# Altium footprint library my Library.PcbLib: 1247 footprints (part 20 of 78)
Each footprint in its own frame and in the unit in brackets; x right, y up, seen from the top. Pads: shape width x height; smd on the part's side, far side on the other; paste and mask are expansions set on the pad; w line width, h text height; cw(c..) or ccw(c..) is an arc to the next point about the centre after c.
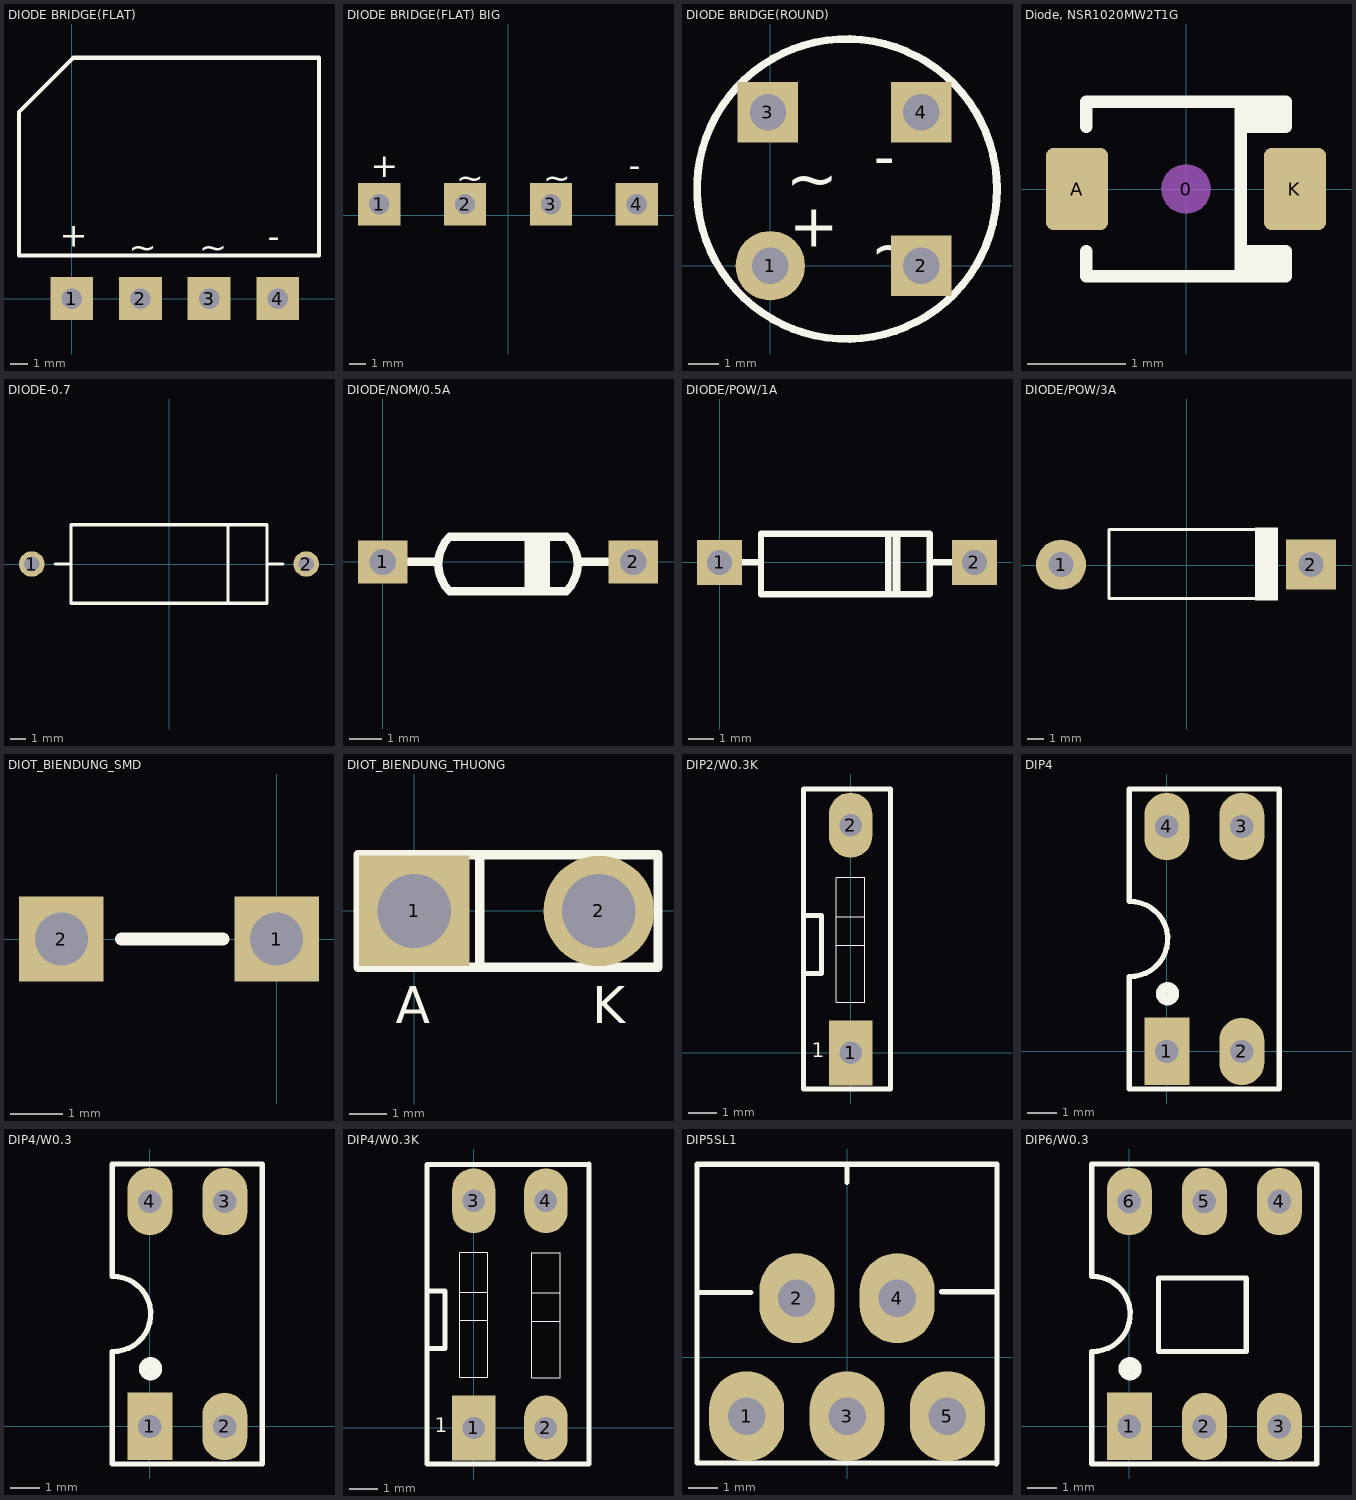
[diagram p19: the footprints below, top view; thin cyan lines are the x and y axes]

## DIODE BRIDGE(FLAT) [mm]
pads (4):
  rect 2.5x2.5 / inner round 1.575 / far side rect 2.5x2.5 hole 1.2: 1(0,0) 2(4,0) 3(8,0) 4(12,0)
Top Overlay:
  lines w0.254: -3.073,2.515 2.045,2.515 14.402,2.515 14.402,14.021 0.076,14.021 -3.073,10.871 -3.073,2.515
  text "~" at 3.327,2.286 h1.43
  text "~" at 7.417,2.299 h1.43
  text "+" at -0.686,3.01 h1.43
  text "-" at 11.405,2.946 h1.43

## DIODE BRIDGE(FLAT) BIG [mm]
pads (4):
  rect 2.5x2.5 hole 1.2: 1(-7.62,0.66) 2(-2.54,0.66) 3(2.54,0.66) 4(7.62,0.66)
Top Overlay:
  text "-" at 7.137,2.286 h1.43
  text "+" at -8.103,2.261 h1.43
  text "~" at 2.083,1.549 h1.43
  text "~" at -3.073,1.549 h1.43
3D body: height 24.27, standoff -12.36, extent -11.15,-1.78 11.15,1.98

## DIODE BRIDGE(ROUND) [mm]
height 5.59
pads (4):
  round 2.3 hole 1.2: 1(0,0)
  rect 2x2 hole 1.2: 2(5,0) 3(-0.08,5.08) 4(5,5.08)
Top Overlay:
  circle w0.254: c2.54,2.54 r4.968
  text "+" at 0.635,0.635 h1.43
  text "-" at 3.429,2.921 h1.43
  text "~" at 0.508,2.159 h1.52
  text "~" at 3.302,-0.127 h1.52

## Diode, NSR1020MW2T1G [mil]
pads (3):
  round 20 on Mech15: 0(0,0)
  rrect25% 25x33 smd: A(-43.75,0) K(43.75,0)
Top Overlay:
  lines w5: -40,-25 -40,-35 40,-35 40,-25 22,-25 ; -40,25 -40,35 40,35 40,25 22,25 ; 22,-35 22,35 ; 25,-35 25,-25 ; 25,25 25,35 ; 28,-35 28,-25 ; 28,25 28,35 ; 31,-35 31,-25 ; 31,25 31,35 ; 34,-35 34,-25 ; 34,25 34,35 ; 37,-35 37,-25 ; 37,25 37,35

## DIODE-0.7 [mm] "Diode, Thru-Hole; 2 Leads; 0.7 in Pin Spacing"
height 5.08
pads (2):
  round 1.65 hole 1: 1(-8.89,0) 2(8.89,0)
Top Overlay:
  lines w0.2: -7.366,0 -6.35,0 ; 3.81,-2.54 3.81,2.54 ; 6.35,0 7.366,0 ; -6.35,-2.54 6.35,-2.54 6.35,2.54 -6.35,2.54 -6.35,-2.54

## DIODE/NOM/0.5A [mm]
pads (2):
  rect 1.5x1.3 hole 0.8: 1(0,0) 2(7.62,0)
Top Overlay:
  lines w0.254: 0.635,0 1.651,0 ; 4.445,-0.762 4.445,0.762 ; 4.699,-0.889 4.699,0.762 ; 4.953,-0.889 4.953,0.762 ; 5.969,0 7.112,0 ; 2.032,-0.889 cw(c2.857,-0.064) 2.032,0.762 5.588,0.762 cw(c4.763,-0.064) 5.588,-0.889 2.032,-0.889

## DIODE/POW/1A [mm]
pads (2):
  rect 1.8x1.8 hole 1: 1(0,0) 2(10.16,0)
Top Overlay:
  lines w0.2: 6.985,-1.27 6.985,1.143 ; 7.112,-1.27 7.112,1.143
  lines w0.254: 0.635,0 1.651,0 ; 6.731,-1.27 6.731,1.143 ; 8.382,0 9.525,0 ; 1.651,-1.27 1.651,1.143 8.382,1.143 8.382,-1.27 1.651,-1.27
3D body "SW3DPS-DIODE0_4.step": height 2.55, standoff -2.54, extent -0.381,-1.283 10.541,1.283

## DIODE/POW/3A [mil]
pads (2):
  round 120 hole 60: 1(-301,1)
  rect 120x120 hole 60: 2(298,1)
Top Overlay:
  rectangle: 164,-85 219,90
  lines w7.87: 214,-65 199,-80 -186,-80 -186,85 194,85 214,65
3D body "User Library-BYW98.step": height 248.03, standoff -92.52, extent -320.86,-104.33 320.87,104.33

## DIOT_BIENDUNG_SMD [mm]
pads (2):
  rect 1.6x1.6 hole 1: 1(0,0) 2(-4.064,0)
Top Overlay:
  lines w0.254: -2.928,0 -1.016,0

## DIOT_BIENDUNG_THUONG [mm]
pads (2):
  rect 3x3 hole 2: 1(0,0)
  round 3 hole 2: 2(5,0)
Top Overlay:
  lines w0.254: 1.778,-1.524 1.778,1.524 ; -1.524,-1.524 6.604,-1.524 6.604,1.524 -1.524,1.524 -1.524,-1.524
  text "A" at -0.508,-3.048 h1
  text "K" at 4.826,-3.048 h1

## DIP2/W0.3K [mil] "2 PIN, W 200mil , L 450mil,Pin to pin 100mil"
height 100
pads (2):
  rect 60x90 hole 31: 1(0,0)
  oval 60x90 hole 31: 2(0,315)
Top Overlay:
  lines w1.5: -19.68,149 19.68,149 ; -19.68,188.37 19.68,188.37 ; -19.68,242 -19.68,70.26 19.68,70.26 19.68,242 ; -19.68,242.74 19.68,242.74
  lines w7: -65,110 -40,110 -40,190 -65,190 ; -65,-50 55,-50 55,365 -65,365 -65,-50
  text "1" at -54,-6 h20
3D body "swdip1_19747.stp": height 129.53, standoff -150, extent -72.5,-51.79 64.5,361.79

## DIP4 [mil] "4 PIN, W 300mil, Pin to pin 100mil"
height 100
pads (4):
  rect 60x90 hole 31: 1(0,0)
  oval 60x90 hole 31: 2(100,0) 3(100,300) 4(0,300)
Top Overlay:
  circle w15: c1,77 r8
  lines w7: -50.38,100.05 ccw(c-48.69,150.02) -50,200 ; -50,100 -50,-50 150,-50 150,350 -50,350 -50,201
3D body "SW3DPS-DIP4-DEFAULT.STEP": height 169.69, standoff -129.13, extent -59.06,-10 159.06,304.96

## DIP4/W0.3 [mil] "4 PIN, W 300mil, Pin to pin 100mil"
height 100
pads (4):
  rect 60x90 hole 31: 1(0,0)
  oval 60x90 hole 31: 2(100,0) 3(100,300) 4(0,300)
Top Overlay:
  circle w15: c1,77 r8
  lines w7: -50.38,100.05 ccw(c-48.69,150.02) -50,200 ; -50,100 -50,-50 150,-50 150,350 -50,350 -50,201
3D body "SW3DPS-DIP4-DEFAULT.STEP": height 169.69, standoff -129.13, extent -59.06,-10 159.06,304.96

## DIP4/W0.3K [mil] "4 PIN, W 400mil , L 450mil,Pin to pin 100mil"
height 100
pads (4):
  rect 60x90 hole 31: 1(0,0)
  oval 60x90 hole 31: 2(100,0) 3(0,315) 4(100,315)
Top Overlay:
  lines w1.5: -19.68,149 19.68,149 ; -19.68,188.37 19.68,188.37 ; -19.68,243 -19.68,70.26 19.68,70.26 19.68,243 ; -19.68,243.74 19.68,243.74 ; 80.31,148 119.69,148 ; 80.31,187.37 119.69,187.37 ; 80.31,242.74 119.69,242.74 ; 80.31,243 80.31,69.26 119.69,69.26 119.69,242
  lines w7: -65,110 -40,110 -40,190 -65,190 ; -65,364 -65,-50 160,-50 160,366 ; -65,365 160,365
  text "1" at -54,-6 h20
3D body "User Library-Switch-Piano-DIP-2.STEP": height 354.33, standoff -157.48, extent -70,-85.43 166.22,361.43

## DIP5SL1 [mm]
pads (5):
  oval 2.54x3.048 hole 1.27: 1(-3.4,-2) 2(-1.7,2) 3(0,-2) 4(1.7,2) 5(3.4,-2)
Top Overlay:
  lines w0.178: -5.076,2.191 -3.248,2.191 ; 0,5.918 0,6.502 ; 3.204,2.216 5.033,2.216 ; -5.08,-3.581 5.029,-3.581 5.055,-3.607 5.08,-3.581 5.08,6.534 -5.08,6.534 -5.08,-3.581
3D body "TO220-5.STEP": height 18.81, standoff -9.47, extent -4.993,-2.246 5.207,6.31

## DIP6/W0.3 [mil] "6 PIN, W 300mil, Pin to pin 100mil"
height 100
pads (6):
  rect 60x90 hole 31.5: 1(0,0)
  oval 60x90 hole 31.5: 2(100,0) 3(200,0) 4(200,300) 5(100,300) 6(0,300)
Top Overlay:
  circle w15: c1,77 r8
  lines w7: -50.38,100.05 ccw(c-48.69,150.02) -50,200 ; -50,100 -50,-50 250,-50 250,350 -50,350 -50,201 ; 39,100 156,100 156,198 39,198 39,100
3D body "SW3DPS-DIP6-DEFAULT.STEP": height 169.69, standoff -129.13, extent -58.11,-7.48 260,307.48